# Altium footprint library rus.PcbLib: 83 footprints (part 4 of 6)
Each footprint in its own frame and in the unit in brackets; x right, y up, seen from the top. Pads: shape width x height; smd on the part's side, far side on the other; paste and mask are expansions set on the pad; w line width, h text height; cw(c..) or ccw(c..) is an arc to the next point about the centre after c.
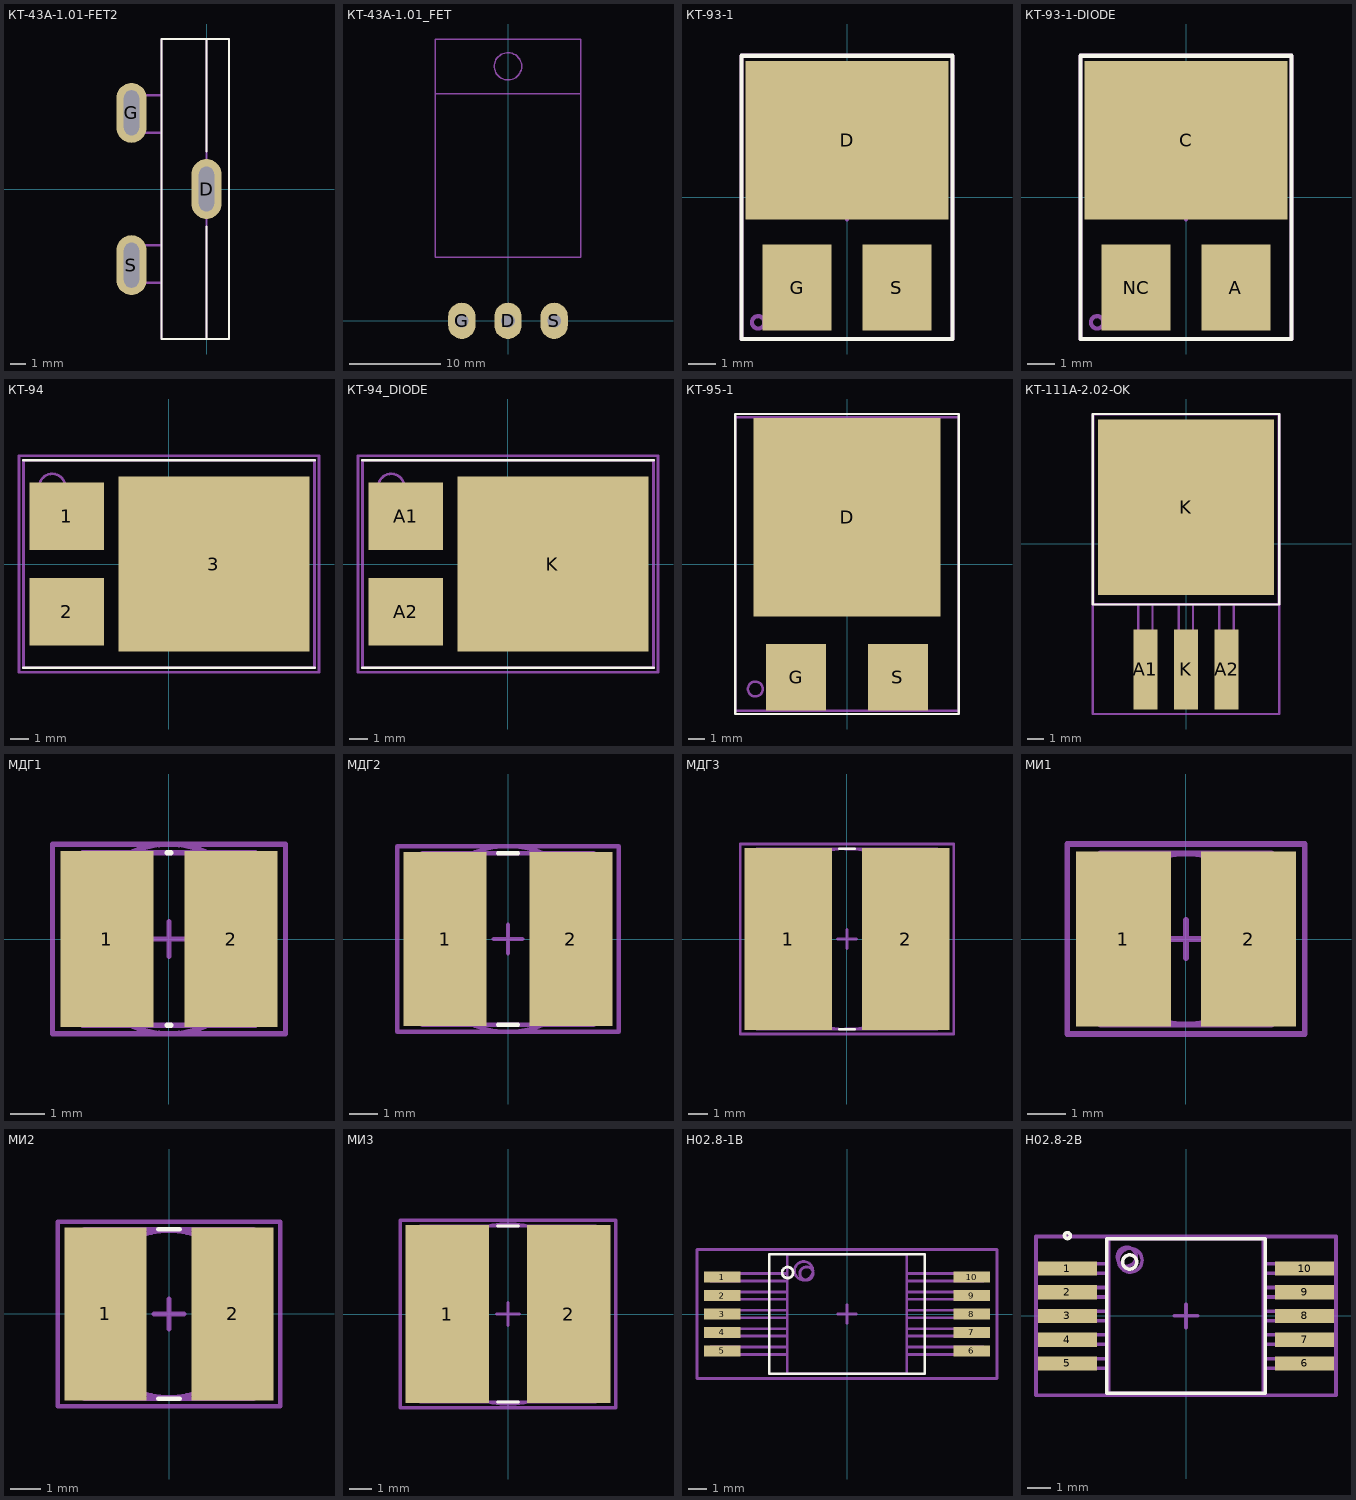
[diagram p3: the footprints below, top view; thin cyan lines are the x and y axes]

## КТ-43А-1.01-FET2 [mm]
height 30
pads (3):
  oval 2x4 hole 1 slot 3 at 90 deg: D(0,0) G(-5,5.08) S(-5,-5.08)
Top Overlay:
  lines w0.15: -0.1,10 1.25,10 1.5,10 1.5,-7.5 1.5,-10 0,-10 ; 0,-2.5 0,-10 ; 0,2.5 0,10 -3,10 -3,-10 0,-10
Mechanical 29:
  lines w0.15: -3,-6.25 -5.25,-6.25 -5.25,-3.75 -3,-3.75 ; -3,3.75 -5.25,3.75 -5.25,6.25 -3,6.25 ; 0,-10 0,10 1.5,10 ; 1.5,10 -3,10 -3,-10 1.5,-10 1.5,10
  text ".Designator" at -1.1,-3.4 h1
3D body "KT-43A-1.01-flex2.STEP": height 32, standoff -1.4, extent -5.3,-10 1.2,10

## КТ-43А-1.01_FET [mm] "КТ-43А-1.01 для полевых транзисторов"
height 5.3
pads (3):
  oval 3x4 hole 1.5: D(0,0) G(-5.08,0) S(5.08,0)
Mechanical 13:
  circle w0.15: c0,28 r1.5
Mechanical 29:
  lines w0.15: -8,25 0,25 8,25 ; -8,7 -8,31 0,31 8,31 8,7 0,7 -8,7
  text ".Designator" at -3.5,15.3 h1
3D body "КТ-43А-1.01.STEP": height 3, standoff -7.3, extent -7.8,-0.3 7.8,30.7

## КТ-93-1 [mm]
height 3
pads (3):
  rect 7.3x5.7 smd: D(0,2.05)
  rect 2.5x3.1 smd: G(-1.8,-3.25) S(1.8,-3.25)
Top Overlay:
  lines w0.15: -3.8,-5.1 -3.8,5.1 3.8,5.1 3.8,-5.1 -3.8,-5.1
Mechanical 15:
  lines w0.15: -0.9,0 0.9,0 ; 0,-0.8 0,0.8
Mechanical 29:
  circle w0.15: c-3.2,-4.5 r0.224
  lines w0.15: -3.8,-5.1 3.8,-5.1 3.8,5.1 -3.8,5.1 -3.8,-5.1
  text ".Designator" at -3.4,-0.3 h1
3D body: height 3, standoff 0, extent -3.85,-5.15 3.85,5.15

## КТ-93-1-DIODE [mm]
height 3
pads (3):
  rect 2.5x3.1 smd: A(1.8,-3.25) NC(-1.8,-3.25)
  rect 7.3x5.7 smd: C(0,2.05)
Top Overlay:
  lines w0.15: -3.8,-5.1 3.8,-5.1 3.8,5.1 -3.8,5.1 -3.8,-5.1
Mechanical 15:
  lines w0.15: -0.9,0 0.9,0 ; 0,-0.8 0,0.8
Mechanical 29:
  circle w0.15: c-3.2,-4.5 r0.224
  lines w0.15: -3.8,-5.1 -3.8,5.1 3.8,5.1 3.8,-5.1 -3.8,-5.1
  text ".Designator" at -2.7,-0.3 h1
3D body: height 3, standoff 0, extent -3.85,-5.15 3.85,5.15

## КТ-94 [mm] "DFN, 3-Leads, Body 11,53x16,10mm, Pitch 8,00mm, IPC Medium Density"
height 3.6
pads (3):
  rect 4.15x3.75 smd: 1(-5.7,2.665) 2(-5.7,-2.665)
  rect 10.65x9.75 smd: 3(2.5,0)
Top Overlay:
  lines w0.15: -8.1,-5.775 8.1,-5.775 ; -8.1,5.775 8.1,5.775
Mechanical 15:
  lines w0.15: -0.5,0 0.5,0 ; 0,-0.5 0,0.5 ; -8.35,-6.025 -8.35,6.025 8.35,6.025 8.35,-6.025 -8.35,-6.025
Mechanical 29:
  circle w0.15: c-6.5,4.3 r0.721
  lines w0.15: -8.1,-5.775 -8.1,5.775 8.1,5.775 8.1,-5.775 -8.1,-5.775
  text ".Designator" at -4.5,-0.7 h1
3D body: height 3.6, standoff 0.5, extent -8.1,-5.775 8.1,5.775

## КТ-94_DIODE [mm] "DFN, 3-Leads, Body 11,53x16,10mm, Pitch 8,00mm, IPC Medium Density"
height 3.6
pads (3):
  rect 4.15x3.75 smd: A1(-5.7,2.665) A2(-5.7,-2.665)
  rect 10.65x9.75 smd: K(2.5,0)
Top Overlay:
  lines w0.15: -8.1,-5.775 8.1,-5.775 ; -8.1,5.775 8.1,5.775
Mechanical 15:
  lines w0.15: -0.5,0 0.5,0 ; 0,-0.5 0,0.5 ; -8.35,-6.025 8.35,-6.025 8.35,6.025 -8.35,6.025 -8.35,-6.025
Mechanical 29:
  circle w0.15: c-6.5,4.3 r0.721
  lines w0.15: -8.1,-5.775 8.1,-5.775 8.1,5.775 -8.1,5.775 -8.1,-5.775
  text ".Designator" at -3.3,-0.4 h1
3D body: height 3.6, standoff 0.5, extent -8.1,-5.775 8.1,5.775

## КТ-95-1 [mm]
height 3.6
pads (3):
  rect 11.2x11.9 smd: D(0,2.8)
  rect 3.6x4 smd: G(-3.05,-6.8) S(3.05,-6.8)
Top Overlay:
  lines w0.15: -6.7,-9 6.7,-9 6.7,9 -6.7,9 -6.7,-9
Mechanical 15:
  lines w0.15: -0.8,0 0.8,0 ; 0,-0.8 0,0.8
Mechanical 29:
  circle w0.15: c-5.5,-7.5 r0.447
  lines w0.15: -6.7,-8.8 6.7,-8.8 6.7,8.8 -6.7,8.8 -6.7,-8.8
  text ".Designator" at -3.8,-0.5 h1
3D body "KT-95-1.STEP": height 3.6, standoff 0, extent -6.7,-8.8 6.7,8.8

## КТ-111А-2.02-OK [mm]
height 4.5
pads (4):
  rect 1.5x5 smd: A1(-2.54,-7.874) A2(2.54,-7.874) K(0,-7.874)
  rect 11x11 smd: K(0,2.286)
Top Overlay:
  lines w0.15: -5.842,-3.81 5.842,-3.81 ; -5.842,-3.81 -5.842,8.128 5.842,8.128 5.842,-3.81 ; -5.842,-3.81 5.842,-3.81
Mechanical 15:
  lines w0.15: -1.27,0 1.27,0 ; 0,-1.27 0,1.27 ; -5.842,-10.668 -5.842,8.128 5.842,8.128 5.842,-10.668 -5.842,-10.668
Mechanical 29:
  lines w0.15: -5.8,-3.8 -5.8,8.1 5.8,8.1 5.8,-3.8 -5.8,-3.8 ; -3,-9.9 -2.1,-9.9 -2.1,-3.8 -3,-3.8 -3,-9.9 ; -0.46,-9.9 -0.46,-3.8 0.44,-3.8 0.44,-9.9 -0.46,-9.9 ; 2.08,-9.9 2.08,-3.8 2.98,-3.8 2.98,-9.9 2.08,-9.9
  text ".Designator" at -3.3,0.5 h1

## МДГ1 [mm] "МДГ1"
height 4.8
pads (2):
  rect 2.7x5.1 smd: 1(-1.8,0) 2(1.8,0)
Top Overlay:
  lines w0.15: -0.05,-2.5 0.05,-2.5 ; -0.05,2.5 0.05,2.5
Mechanical 13:
  lines w0.15: -2.5,-2.5 -2.5,2.5 2.5,2.5 2.5,-2.5 -2.5,-2.5
Mechanical 15:
  lines w0.15: -0.5,0 0.5,0 ; 0,-0.5 0,0.5 ; -3.375,-2.75 -3.375,2.75 3.375,2.75 3.375,-2.75 -3.375,-2.75
Mechanical 29:
  circle w0.15: c0,0 r2.75
  text ".Designator" at -2.1,-0.3 h1
3D body "INDP5050X48N.step": height 4.9, standoff 0, extent -2.6,-2.5 2.6,2.5

## МДГ2 [mm] "МДГ2"
height 6
pads (2):
  rect 2.9x6.1 smd: 1(-2.2,0) 2(2.2,0)
Top Overlay:
  lines w0.15: -0.35,-3 0.35,-3 ; -0.35,3 0.35,3
Mechanical 13:
  lines w0.15: -3,-3 3,-3 3,3 -3,3 -3,-3
Mechanical 15:
  lines w0.15: -0.5,0 0.5,0 ; 0,-0.5 0,0.5 ; -3.875,-3.25 3.875,-3.25 3.875,3.25 -3.875,3.25 -3.875,-3.25
Mechanical 29:
  circle w0.15: c0,0 r3.25
  text ".Designator" at -2.5,-0.3 h1
3D body "INDP6060X60N.step": height 6.1, standoff 0, extent -3.1,-3 3.1,3

## МДГ3 [mm] "МДГ3"
height 6.3
pads (2):
  rect 4.6x9.6 smd: 1(-3.1,0) 2(3.1,0)
Top Overlay:
  lines w0.15: -0.4,-4.75 0.4,-4.75 ; -0.4,4.75 0.4,4.75
Mechanical 13:
  lines w0.15: -4.75,-4.75 4.75,-4.75 4.75,4.75 -4.75,4.75 -4.75,-4.75
Mechanical 15:
  lines w0.15: -0.5,0 0.5,0 ; 0,-0.5 0,0.5 ; -5.625,-5 5.625,-5 5.625,5 -5.625,5 -5.625,-5
Mechanical 29:
  circle w0.15: c0,0 r4.75
  text ".Designator" at -3.1,-0.4 h1
3D body "INDP9595X63N.step": height 6.4, standoff 0, extent -4.85,-4.75 4.85,4.75

## МИ1 [mm] "МИ1"
height 4.6
pads (2):
  rect 2.5x4.6 smd: 1(-1.65,0) 2(1.65,0)
Mechanical 13:
  lines w0.15: -2.25,-2.25 2.25,-2.25 2.25,2.25 -2.25,2.25 -2.25,-2.25
Mechanical 15:
  lines w0.15: -0.5,0 0.5,0 ; 0,-0.5 0,0.5 ; -3.125,-2.5 3.125,-2.5 3.125,2.5 -3.125,2.5 -3.125,-2.5
Mechanical 29:
  circle w0.15: c0,0 r2.25
  text ".Designator" at -1.9,-0.3 h1
3D body "INDP4545X46N.step": height 4.7, standoff 0, extent -2.35,-2.25 2.35,2.25

## МИ2 [mm] "МИ2"
height 5.8
pads (2):
  rect 2.7x5.7 smd: 1(-2.1,0) 2(2.1,0)
Top Overlay:
  lines w0.15: -0.35,-2.8 0.35,-2.8 ; -0.35,2.8 0.35,2.8
Mechanical 13:
  lines w0.15: -2.8,-2.8 2.8,-2.8 2.8,2.8 -2.8,2.8 -2.8,-2.8
Mechanical 15:
  lines w0.15: -0.5,0 0.5,0 ; 0,-0.5 0,0.5 ; -3.675,-3.05 3.675,-3.05 3.675,3.05 -3.675,3.05 -3.675,-3.05
Mechanical 29:
  circle w0.15: c0,0 r2.75
  text ".Designator" at -2.2,-0.3 h1
3D body "INDP5656X58N.step": height 5.9, standoff 0, extent -2.9,-2.8 2.9,2.8

## МИ3 [mm] "МИ3"
height 5.9
pads (2):
  rect 3.7x7.9 smd: 1(-2.7,0) 2(2.7,0)
Top Overlay:
  lines w0.15: -0.45,-3.9 0.45,-3.9 ; -0.45,3.9 0.45,3.9
Mechanical 13:
  lines w0.15: -3.9,-3.9 -3.9,3.9 3.9,3.9 3.9,-3.9 -3.9,-3.9
Mechanical 15:
  lines w0.15: -0.5,0 0.5,0 ; 0,-0.5 0,0.5 ; -4.775,-4.15 -4.775,4.15 4.775,4.15 4.775,-4.15 -4.775,-4.15
Mechanical 29:
  circle w0.15: c0,0 r4
  text ".Designator" at -3,-0.3 h1
3D body "INDP7878X59N.step": height 6, standoff 0, extent -4,-3.9 4,3.9

## Н02.8-1В [mm] "CFP, 10-Leads, Body 6,50x6,50mm (max), Pitch 1,00mm, IPC Medium Density"
height 3.4
pads (10):
  rect 2x0.6 smd: 1(-6.775,2) 2(-6.775,1) 3(-6.775,0) 4(-6.775,-1) 5(-6.775,-2) 6(6.775,-2) 7(6.775,-1) 8(6.775,0) 9(6.775,1) 10(6.775,2)
Top Overlay:
  circle w0.15: c-3.225,2.25 r0.3
  lines w0.15: -4.225,-3.25 -4.225,3.25 4.225,3.25 4.225,-3.25 -4.225,-3.25
Mechanical 13:
  circle w0.15: c-2.35,2.35 r0.5
Mechanical 15:
  lines w0.15: -0.5,0 0.5,0 ; 0,-0.5 0,0.5 ; -8.15,-3.5 -8.15,3.5 8.15,3.5 8.15,-3.5 -8.15,-3.5
Mechanical 29:
  circle w0.15: c-2.2,2.2 r0.361
  lines w0.15: -7.4,-2.2 -7.4,-2.1 -7.4,-1.8 -3.25,-1.8 -3.25,-2.2 -7.4,-2.2 ; -7.4,-1.2 -7.4,-1.1 -7.4,-0.8 -3.25,-0.8 -3.25,-1.2 -7.4,-1.2 ; -7.4,-0.2 -7.4,-0.1 -7.4,0.2 -3.25,0.2 -3.25,-0.2 -7.4,-0.2 ; -7.4,0.8 -7.4,0.9 -7.4,1.2 -3.25,1.2 -3.25,0.8 -7.4,0.8 ; -7.4,1.8 -3.25,1.8 -3.25,2.2 -7.4,2.2 -7.4,1.9 -7.4,1.8 ; -3.25,-3.25 -3.25,3.25 3.25,3.25 3.25,-3.25 -3.25,-3.25 ; 3.25,-2.2 3.25,-1.8 7.4,-1.8 7.4,-2.1 7.4,-2.2 3.25,-2.2 ; 3.25,-1.2 3.25,-0.8 7.4,-0.8 7.4,-1.1 7.4,-1.2 3.25,-1.2 ; 3.25,-0.2 3.25,0.2 7.4,0.2 7.4,-0.1 7.4,-0.2 3.25,-0.2 ; 3.25,0.8 3.25,1.2 7.4,1.2 7.4,0.9 7.4,0.8 3.25,0.8 ; 3.25,1.8 7.4,1.8 7.4,1.9 7.4,2.2 3.25,2.2 3.25,1.8
  text ".Designator" at -2.8,-0.4 h1
3D body "Н02.8-1В.STEP": height 2.9, standoff 0, extent -7.5,-3.25 7.5,3.25

## Н02.8-2В [mm] "Н02.8-2В"
height 2.9
pads (10):
  rect 2.5x0.6 smd: 1(-5,2) 2(-5,1) 3(-5,0) 4(-5,-1) 5(-5,-2) 6(5,-2) 7(5,-1) 8(5,0) 9(5,1) 10(5,2)
Top Overlay:
  circle w0.15: c-5,3.39 r0.125
  circle w0.15: c-2.375,2.275 r0.3
  lines w0.15: -3.35,-3.25 -3.35,3.25 3.35,3.25 3.35,-3.25 -3.35,-3.25
Mechanical 13:
  circle w0.15: c-2.35,2.35 r0.5
Mechanical 15:
  lines w0.15: -0.5,0 0.5,0 ; 0,-0.5 0,0.5 ; -6.325,-3.35 -6.325,3.35 6.325,3.35 6.325,-3.35 -6.325,-3.35
Mechanical 29:
  circle w0.15: c-2.5,2.5 r0.4
  lines w0.15: -6,-2.2 -3.25,-2.2 -3.25,-1.8 -6,-1.8 -6,-2.1 -6,-2.2 ; -6,-1.2 -3.25,-1.2 -3.25,-0.8 -6,-0.8 -6,-1.1 -6,-1.2 ; -6,-0.2 -3.25,-0.2 -3.25,0.2 -6,0.2 -6,-0.1 -6,-0.2 ; -6,0.8 -3.25,0.8 -3.25,1.2 -6,1.2 -6,0.9 -6,0.8 ; -6,1.8 -6,1.9 -6,2.2 -3.25,2.2 -3.25,1.8 -6,1.8 ; -3.25,-3.25 -3.25,3.25 3.25,3.25 3.25,-3.25 -3.25,-3.25 ; 3.25,-2.2 6,-2.2 6,-2.1 6,-1.8 3.25,-1.8 3.25,-2.2 ; 3.25,-1.2 6,-1.2 6,-1.1 6,-0.8 3.25,-0.8 3.25,-1.2 ; 3.25,-0.2 6,-0.2 6,-0.1 6,0.2 3.25,0.2 3.25,-0.2 ; 3.25,0.8 6,0.8 6,0.9 6,1.2 3.25,1.2 3.25,0.8 ; 3.25,1.8 3.25,2.2 6,2.2 6,1.9 6,1.8 3.25,1.8
  text ".Designator" at -2.8,-0.3 h1
3D body: height 2.9, standoff 0.5, extent -3.25,-3.25 3.25,3.25